# Altium footprint library PROC051C_PCB.PcbLib: 118 footprints (part 7 of 8)
Each footprint in its own frame and in the unit in brackets; x right, y up, seen from the top. Pads: shape width x height; smd on the part's side, far side on the other; paste and mask are expansions set on the pad; w line width, h text height; cw(c..) or ccw(c..) is an arc to the next point about the centre after c.
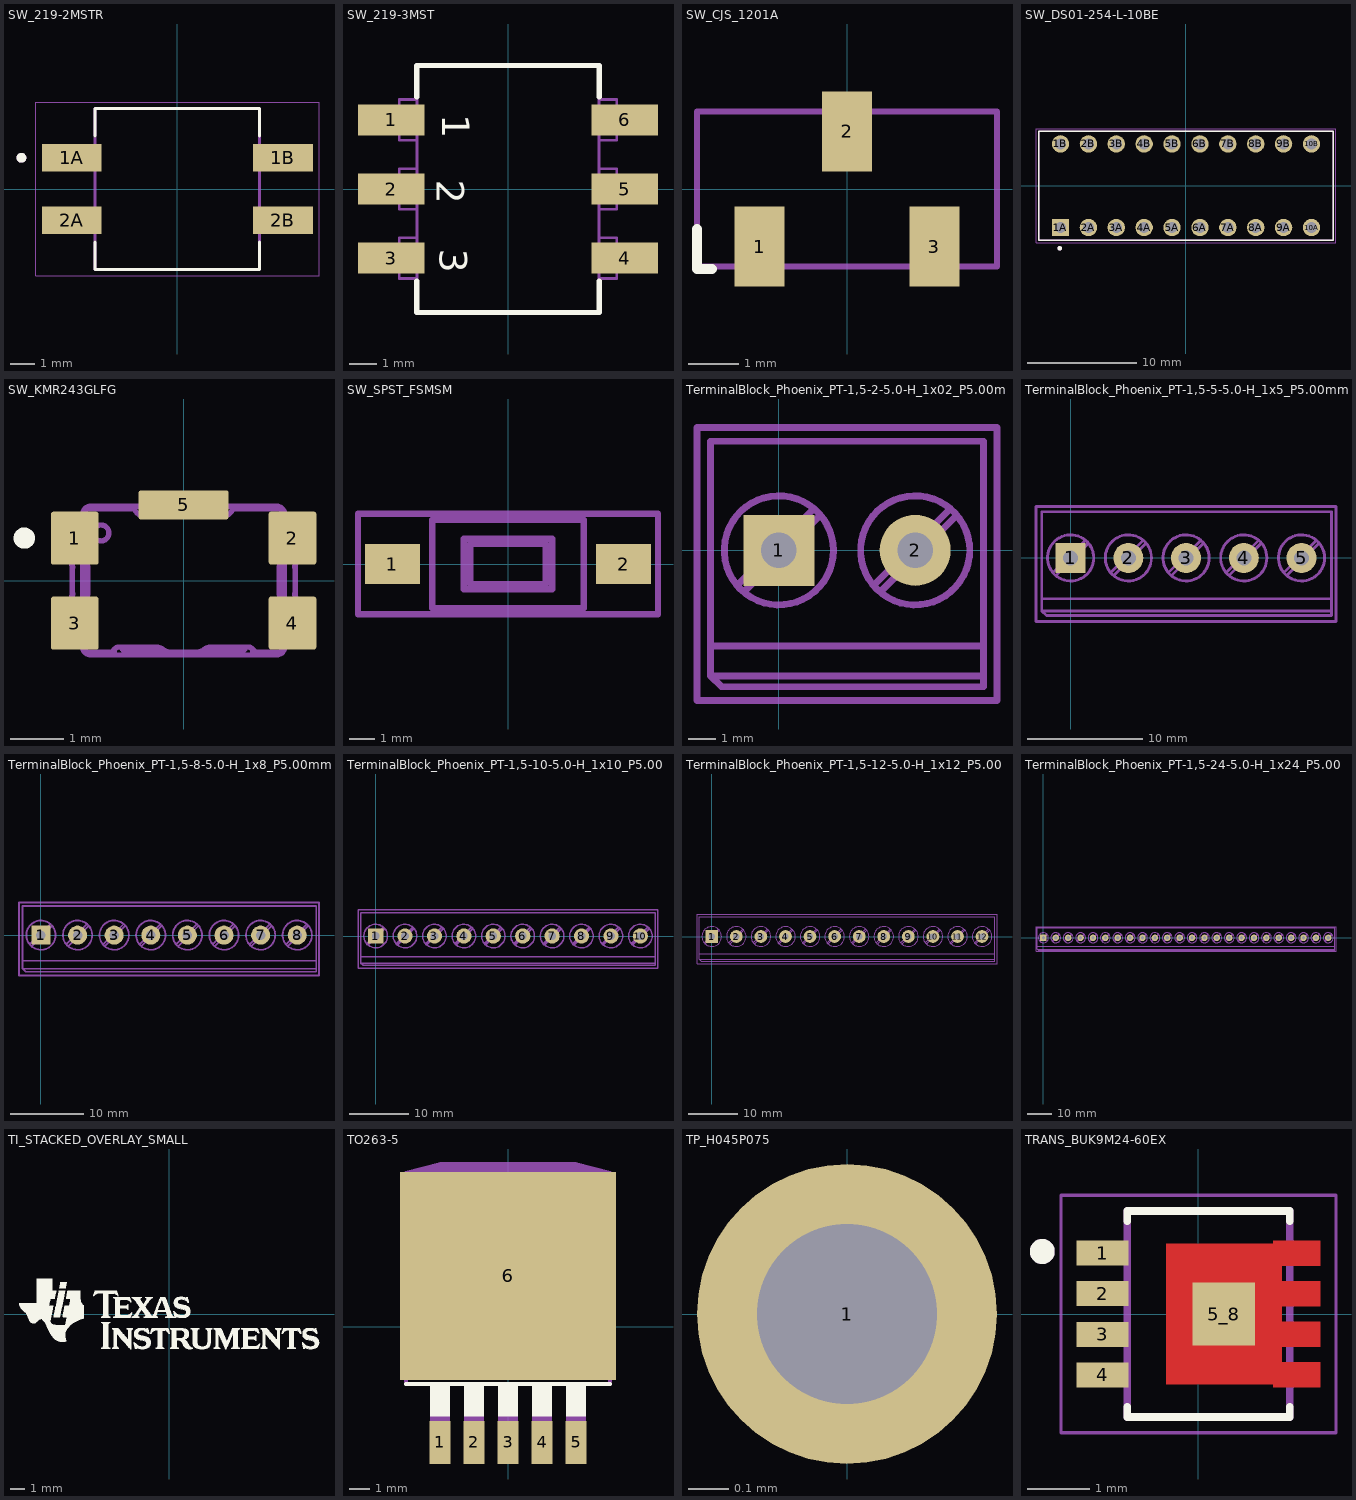
[diagram p6: the footprints below, top view; thin cyan lines are the x and y axes]

## SW_219-2MSTR [mm]
height 3.85
pads (4):
  rect 2.44x1.13 smd: 1A(-4.3,1.27) 1B(4.3,1.27) 2A(-4.3,-1.27) 2B(4.3,-1.27)
Top Overlay:
  circle w0.2: c-6.35,1.27 r0.1
  lines w0.127: -3.35,-2.155 -3.35,-3.275 3.35,-3.275 3.35,-2.155 ; -3.35,2.155 -3.35,3.275 3.35,3.275 3.35,2.155
Mechanical 13:
  circle w0.2: c-6.35,1.27 r0.1
  lines w0.127: -3.35,-3.275 3.35,-3.275 3.35,3.275 -3.35,3.275 -3.35,-3.275
Mechanical 15:
  lines w0.05: -5.77,-3.525 -5.77,3.525 5.77,3.525 5.77,-3.525 -5.77,-3.525
3D body "step_temp.STEP": height 4.58, standoff 0, extent -4.955,-3.275 4.955,3.275

## SW_219-3MST [mm] "SMD, 6-Leads, Body 6.7x9.09mm, Pitch 2.54mm"
height 4.23
pads (6):
  rect 2.44x1.13 smd: 1(-4.3,2.54) 2(-4.3,0) 3(-4.3,-2.54) 4(4.3,-2.54) 5(4.3,0) 6(4.3,2.54)
Top Overlay:
  lines w0.2: -3.35,-3.4 -3.35,-4.545 3.35,-4.545 3.35,-3.4 ; -3.35,3.4 -3.35,4.545 3.35,4.545 3.35,3.4
  text "1" at -2.422,2.758 h1.02
  text "2" at -2.63,0.336 h1.02
  text "3" at -2.504,-2.204 h1.02
Mechanical 5:
  lines w0.1: -4,-2.815 -4.955,-2.815 -4.955,-2.265 -4,-2.265 ; -4,-0.275 -4.955,-0.275 -4.955,0.275 -4,0.275 ; -4,2.265 -4.955,2.265 -4.955,2.815 -4,2.815 ; -3.35,-3.29 -3.8,-3.29 -4,-3.29 -4,-1.79 -3.8,-1.79 -3.35,-1.79 ; -3.35,-0.75 -3.8,-0.75 -4,-0.75 -4,0.75 -3.8,0.75 -3.35,0.75 ; -3.35,1.79 -3.8,1.79 -4,1.79 -4,3.29 -3.8,3.29 -3.35,3.29 ; 3.35,-3.29 3.8,-3.29 4,-3.29 4,-1.79 3.8,-1.79 3.35,-1.79 ; 3.35,-0.75 3.8,-0.75 4,-0.75 4,0.75 3.8,0.75 3.35,0.75 ; 3.35,1.79 3.8,1.79 4,1.79 4,3.29 3.8,3.29 3.35,3.29 ; 4,-2.815 4.955,-2.815 4.955,-2.265 4,-2.265 ; 4,-0.275 4.955,-0.275 4.955,0.275 4,0.275 ; 4,2.265 4.955,2.265 4.955,2.815 4,2.815 ; -3.35,-4.545 -3.35,4.545 3.35,4.545 3.35,-3.545 3.35,-4.545 -3.35,-4.545
  text ".Designator" at -0.52,1.29 h1.85
  text "3" at -2.504,-2.204 h1.02
  text "2" at -2.63,0.336 h1.02
  text "1" at -2.422,2.758 h1.02
3D body: height 4.3, standoff 0, extent -4.955,-4.545 4.955,4.545

## SW_CJS_1201A [mm] "Copal- Electronics"
height 2.5
pads (3):
  rect 1x1.6 smd paste+0 mask+0.05: 1(-1.75,-1.15) 2(0,1.15) 3(1.75,-1.15)
Top Overlay:
  lines w0.2: -3,-0.8 -3,-1.6 -2.7,-1.6
Mechanical 5:
  lines w0.127: -3,-1.55 3,-1.55 3,1.55 -3,1.55 -3,-1.55
  text ".Designator" at -2.25,-0.25 h1.02
3D body: height 2.51, standoff 1, extent -1.5,-0.5 1.5,0.5
3D body: height 2.5, standoff 0, extent -2.999,-1.549 2.999,1.549

## SW_DS01-254-L-10BE [mm]
height 7
pads (20):
  rect 1.58x1.58 / inner round 1.58 / far side rect 1.58x1.58 hole 1: 1A(-11.43,-3.81)
  round 1.58 hole 1: 1B(-11.43,3.81) 2A(-8.89,-3.81) 2B(-8.89,3.81) 3A(-6.35,-3.81) 3B(-6.35,3.81) 4A(-3.81,-3.81) 4B(-3.81,3.81) 5A(-1.27,-3.81) 5B(-1.27,3.81) 6A(1.27,-3.81) 6B(1.27,3.81) 7A(3.81,-3.81) 7B(3.81,3.81) 8A(6.35,-3.81) 8B(6.35,3.81) 9A(8.89,-3.81) 9B(8.89,3.81) 10A(11.43,-3.81) 10B(11.43,3.81)
Top Overlay:
  circle w0.2: c-11.5,-5.7 r0.1
  lines w0.127: -13.41,-4.95 13.41,-4.95 13.41,4.95 -13.41,4.95 -13.41,-4.95
Mechanical 13:
  circle w0.2: c-11.5,-5.7 r0.1
  lines w0.127: -13.41,-4.95 13.41,-4.95 13.41,4.95 -13.41,4.95 -13.41,-4.95
Mechanical 15:
  lines w0.05: -13.66,-5.2 13.66,-5.2 13.66,5.2 -13.66,5.2 -13.66,-5.2
3D body "step_temp.STEP": height 5.18, standoff -5.18, extent -13.41,-4.947 13.41,4.953

## SW_KMR243GLFG [mm] "SMD, 5-Leads, Body 4.2x2.8mm"
height 1.9
pads (5):
  rrect11% 0.9x1 smd: 1(-2.05,0.8) 2(2.05,0.8) 3(-2.05,-0.8) 4(2.05,-0.8)
  rrect18% 1.7x0.55 smd: 5(0,1.425)
Top Overlay:
  circle w0.2: c-3,0.8 r0.1
Mechanical 5:
  drawing of 4459 lines, arcs and shapes, not listed
  text ".Designator" at 0.855,0.117 h1
3D body: height 1.92, standoff -0.02, extent -2.3,-1.4 2.3,1.4

## SW_SPST_FSMSM [mm]
pads (2):
  rect 2.18x1.6 smd: 1(-4.59,0) 2(4.59,0)
Mechanical 4:
  lines w0.254: -5.95,-2 5.95,-2 5.95,2 -5.95,2 -5.95,-2
Mechanical 6:
  lines w0.254: -3,-1.75 3,-1.75 3,1.75 -3,1.75 -3,-1.75 ; -1.75,-1 1.75,-1 1.75,1 -1.75,1 -1.75,-1 ; -1.5,-0.8 1.5,-0.8 1.5,0.8 -1.5,0.8 -1.5,-0.8
  text "'.Designator'" at -1.439,2.202 h1
3D body "SW_SPST_FSMSM.step": height 2, standoff 0, extent -4.5,-1.722 4.5,1.778

## TerminalBlock_Phoenix_PT-1,5-2-5.0-H_1x02_P5.00mm_Horizontal [mm]
pads (2):
  rect 2.6x2.6 hole 1.3: 1(0,0)
  round 2.6 hole 1.3: 2(5,0)
Mechanical 4:
  lines w0.254: -3,-5.5 8,-5.5 8,4.5 -3,4.5 -3,-5.5
Mechanical 6:
  circle w0.254: c5,0 r2
  circle w0.254: c0,0 r2
  lines w0.254: -2.5,-3.5 7.5,-3.5 ; -1.517,-1.273 1.273,1.517 ; -1.273,-1.517 1.517,1.273 ; 3.484,-1.273 6.273,1.517 ; 3.728,-1.517 6.517,1.273 ; 7.5,-4.6 -2.5,-4.6 ; -2.5,-4.6 -2.1,-5 7.5,-5 7.5,4 -2.5,4 -2.5,-4.6
  text "'.Designator'" at 1.061,-3.298 h1
3D body "TerminalBlock_Phoenix_PT-1,5-2-5.0-H_1x02_P5.00mm_Horizontal.step": height 11.4, standoff -3.6, extent -2.5,-5 8.07,4

## TerminalBlock_Phoenix_PT-1,5-5-5.0-H_1x5_P5.00mm_Horizontal [mm]
pads (5):
  rect 2.6x2.6 hole 1.3: 1(0,0)
  round 2.6 hole 1.3: 2(5,0) 3(10,0) 4(15,0) 5(20,0)
Mechanical 4:
  lines w0.254: -3,-5.5 -3,4.445 22.987,4.445 22.987,-5.5 -3,-5.5
Mechanical 6:
  circle w0.254: c20,0 r2
  circle w0.254: c15,0 r2
  circle w0.254: c10,0 r2
  circle w0.254: c5,0 r2
  circle w0.254: c0,0 r2
  lines w0.254: -2.5,-3.5 22.606,-3.535 ; -1.517,-1.273 1.273,1.517 ; -1.273,-1.517 1.517,1.273 ; 3.484,-1.273 6.273,1.517 ; 3.728,-1.517 6.517,1.273 ; 8.484,-1.273 11.273,1.517 ; 8.728,-1.517 11.517,1.273 ; 13.484,-1.273 16.273,1.517 ; 13.728,-1.517 16.517,1.273 ; 18.484,-1.273 21.273,1.517 ; 18.728,-1.517 21.517,1.273 ; 22.606,-4.6 -2.5,-4.6 ; -2.5,-4.6 -2.1,-5 22.606,-5 22.606,-2.75 22.606,1.75 22.606,4 -2.5,4 -2.5,-4.6
  text "'.Designator'" at 8.763,-3.048 h1
3D body "TerminalBlock_Phoenix_PT-1,5-5-5.0-H_1x05_P5.00mm_Horizontal.step": height 11.4, standoff -3.6, extent -2.54,-4.936 23.03,4.064

## TerminalBlock_Phoenix_PT-1,5-8-5.0-H_1x8_P5.00mm_Horizontal [mm]
pads (8):
  rect 2.6x2.6 hole 1.3: 1(0,0)
  round 2.6 hole 1.3: 2(5,0) 3(10,0) 4(15,0) 5(20,0) 6(25,0) 7(30,0) 8(35,0)
Mid-Layer 26:
  circle w0.254: c0,0 r2.18
  circle w0.254: c5,0 r2.18
  circle w0.254: c10,0 r2.18
  circle w0.254: c15,0 r2.18
  circle w0.254: c20,0 r2.18
  circle w0.254: c25,0 r2.18
  circle w0.254: c30,0 r2.18
  circle w0.254: c35,0 r2.18
  lines w0.254: -2.8,-4.66 -2.8,-5.3 -2.4,-5.3 ; -2.56,-4.6 37.592,-4.6 ; -2.56,-3.5 37.592,-3.5 ; -1.654,-1.388 -1.548,-1.281 ; -1.388,-1.654 -1.282,-1.547 ; 1.281,1.547 1.388,1.654 ; 1.547,1.281 1.654,1.388 ; 3.347,-1.388 3.742,-0.992 ; 3.613,-1.654 3.993,-1.274 ; 6.008,1.274 6.388,1.654 ; 6.259,0.992 6.654,1.388 ; 8.347,-1.388 8.742,-0.992 ; 8.613,-1.654 8.993,-1.274 ; 11.008,1.274 11.388,1.654 ; 11.259,0.992 11.654,1.388 ; 13.347,-1.388 13.742,-0.992 ; 13.613,-1.654 13.993,-1.274 ; 16.008,1.274 16.388,1.654 ; 16.259,0.992 16.654,1.388 ; 18.347,-1.388 18.742,-0.992 ; 18.613,-1.654 18.993,-1.274 ; 21.008,1.274 21.388,1.654 ; 21.259,0.992 21.654,1.388 ; 23.347,-1.388 23.742,-0.992 ; 23.613,-1.654 23.993,-1.274 ; 26.008,1.274 26.388,1.654 ; 26.259,0.992 26.654,1.388 ; 28.347,-1.388 28.742,-0.992 ; 28.613,-1.654 28.993,-1.274 ; 31.008,1.274 31.388,1.654 ; 31.259,0.992 31.654,1.388 ; 33.347,-1.388 33.742,-0.992 ; 33.613,-1.654 33.993,-1.274 ; 36.008,1.274 36.388,1.654 ; 36.259,0.992 36.654,1.388 ; -2.56,-5.06 -2.56,4.06 37.592,4.06 37.592,-5.06 -2.56,-5.06
Mechanical 4:
  lines w0.254: -3,-5.5 37.973,-5.5 37.973,4.445 -3,4.445 -3,-5.5
Mechanical 6:
  circle w0.254: c0,0 r2
  circle w0.254: c5,0 r2
  circle w0.254: c10,0 r2
  circle w0.254: c15,0 r2
  circle w0.254: c20,0 r2
  circle w0.254: c25,0 r2
  circle w0.254: c30,0 r2
  circle w0.254: c35,0 r2
  lines w0.254: -2.5,-3.5 37.592,-3.556 ; -1.517,-1.273 1.273,1.517 ; -1.273,-1.517 1.517,1.273 ; 3.484,-1.273 6.273,1.517 ; 3.728,-1.517 6.517,1.273 ; 8.484,-1.273 11.273,1.517 ; 8.728,-1.517 11.517,1.273 ; 13.484,-1.273 16.273,1.517 ; 13.728,-1.517 16.517,1.273 ; 18.484,-1.273 21.273,1.517 ; 18.728,-1.517 21.517,1.273 ; 23.484,-1.273 26.273,1.517 ; 23.728,-1.517 26.517,1.273 ; 28.484,-1.273 31.273,1.517 ; 28.728,-1.517 31.517,1.273 ; 33.484,-1.273 36.273,1.517 ; 33.728,-1.517 36.517,1.273 ; 37.592,-4.6 -2.5,-4.6 ; -2.5,-4.6 -2.5,4 37.592,4 37.592,1.75 37.592,-2.75 37.592,-5 -2.1,-5 -2.5,-4.6
  text "'.Designator'" at 21.061,-3.298 h1

## TerminalBlock_Phoenix_PT-1,5-10-5.0-H_1x10_P5.00mm_Horizontal [mm]
pads (10):
  rect 2.6x2.6 hole 1.3: 1(0,0)
  round 2.6 hole 1.3: 2(5,0) 3(10,0) 4(15,0) 5(20,0) 6(25,0) 7(30,0) 8(35,0) 9(40,0) 10(45,0)
Mechanical 4:
  lines w0.254: -3,-5.5 -3,4.5 48,4.5 48,-5.5 -3,-5.5
Mechanical 6:
  circle w0.254: c0,0 r2
  circle w0.254: c5,0 r2
  circle w0.254: c10,0 r2
  circle w0.254: c15,0 r2
  circle w0.254: c20,0 r2
  circle w0.254: c25,0 r2
  circle w0.254: c30,0 r2
  circle w0.254: c35,0 r2
  circle w0.254: c40,0 r2
  circle w0.254: c45,0 r2
  lines w0.254: -2.5,-3.5 47.5,-3.5 ; -1.517,-1.273 1.273,1.517 ; -1.273,-1.517 1.517,1.273 ; 3.484,-1.273 6.273,1.517 ; 3.728,-1.517 6.517,1.273 ; 8.484,-1.273 11.273,1.517 ; 8.728,-1.517 11.517,1.273 ; 13.484,-1.273 16.273,1.517 ; 13.728,-1.517 16.517,1.273 ; 18.484,-1.273 21.273,1.517 ; 18.728,-1.517 21.517,1.273 ; 23.484,-1.273 26.273,1.517 ; 23.728,-1.517 26.517,1.273 ; 28.484,-1.273 31.273,1.517 ; 28.728,-1.517 31.517,1.273 ; 33.484,-1.273 36.273,1.517 ; 33.728,-1.517 36.517,1.273 ; 38.484,-1.273 41.273,1.517 ; 38.728,-1.517 41.517,1.273 ; 43.484,-1.273 46.273,1.517 ; 43.728,-1.517 46.517,1.273 ; 47.5,-4.6 -2.5,-4.6 ; -2.5,-4.6 -2.5,4 47.5,4 47.5,-5 -2.1,-5 -2.5,-4.6
  text "'.Designator'" at 21.061,-3.298 h1
3D body "TerminalBlock_Phoenix_PT-1,5-10-5.0-H_1x10_P5.00mm_Horizontal.step": height 11.4, standoff -3.6, extent -2.54,-4.936 48.03,4.064

## TerminalBlock_Phoenix_PT-1,5-12-5.0-H_1x12_P5.00mm_Horizontal [mm]
pads (12):
  rect 2.6x2.6 hole 1.3: 1(0,0)
  round 2.6 hole 1.3: 2(5,0) 3(10,0) 4(15,0) 5(20,0) 6(25,0) 7(30,0) 8(35,0) 9(40,0) 10(45,0) 11(50,0) 12(55,0)
Mechanical 4:
  lines w0.254: -3,-5.5 58.039,-5.5 58.039,4.5 -3,4.5 -3,-5.5
Mechanical 6:
  circle w0.254: c45,0 r2
  circle w0.254: c40,0 r2
  circle w0.254: c35,0 r2
  circle w0.254: c30,0 r2
  circle w0.254: c25,0 r2
  circle w0.254: c20,0 r2
  circle w0.254: c15,0 r2
  circle w0.254: c10,0 r2
  circle w0.254: c5,0 r2
  circle w0.254: c0,0 r2
  circle w0.254: c50,0 r2
  circle w0.254: c55,0 r2
  lines w0.254: -2.5,-3.5 57.404,-3.5 ; -1.517,-1.273 1.273,1.517 ; -1.273,-1.517 1.517,1.273 ; 3.484,-1.273 6.273,1.517 ; 3.728,-1.517 6.517,1.273 ; 8.484,-1.273 11.273,1.517 ; 8.728,-1.517 11.517,1.273 ; 13.484,-1.273 16.273,1.517 ; 13.728,-1.517 16.517,1.273 ; 18.484,-1.273 21.273,1.517 ; 18.728,-1.517 21.517,1.273 ; 23.484,-1.273 26.273,1.517 ; 23.728,-1.517 26.517,1.273 ; 28.484,-1.273 31.273,1.517 ; 28.728,-1.517 31.517,1.273 ; 33.484,-1.273 36.273,1.517 ; 33.728,-1.517 36.517,1.273 ; 38.484,-1.273 41.273,1.517 ; 38.728,-1.517 41.517,1.273 ; 43.484,-1.273 46.273,1.517 ; 43.728,-1.517 46.517,1.273 ; 48.484,-1.273 51.273,1.517 ; 48.728,-1.517 51.517,1.273 ; 53.484,-1.273 56.273,1.517 ; 53.728,-1.517 56.517,1.273 ; 57.404,-4.6 -2.5,-4.6 ; 57.531,-5 -2.1,-5 -2.5,-4.6 ; 57.531,4 -2.5,4 -2.5,-4.6 ; 57.54,-5 57.54,4
  text "'.Designator'" at 21.061,-3.298 h1
3D body "TerminalBlock_Phoenix_PT-1,5-12-5.0-H_1x12_P5.00mm_Horizontal.step": height 11.4, standoff -3.6, extent -2.54,-4.936 58.03,4.064

## TerminalBlock_Phoenix_PT-1,5-24-5.0-H_1x24_P5.00mm_Horizontal [mm]
pads (24):
  rect 2.6x2.6 hole 1.3: 1(0,0)
  round 2.6 hole 1.3: 2(5,0) 3(10,0) 4(15,0) 5(20,0) 6(25,0) 7(30,0) 8(35,0) 9(40,0) 10(45,0) 11(50,0) 12(55,0) 13(60,0) 14(65,0) 15(70,0) 16(75,0) 17(80,0) 18(85,0) 19(90,0) 20(95,0) 21(100,0) 22(105,0) 23(110,0) 24(115,0)
Mechanical 4:
  lines w0.254: -3,-5.5 118.1,-5.5 118.1,4.5 -3,4.5 -3,-5.5
Mechanical 6:
  circle w0.254: c95,0 r2
  circle w0.254: c115,0 r2
  circle w0.254: c110,0 r2
  circle w0.254: c105,0 r2
  circle w0.254: c100,0 r2
  circle w0.254: c90,0 r2
  circle w0.254: c85,0 r2
  circle w0.254: c80,0 r2
  circle w0.254: c75,0 r2
  circle w0.254: c70,0 r2
  circle w0.254: c65,0 r2
  circle w0.254: c60,0 r2
  circle w0.254: c55,0 r2
  circle w0.254: c50,0 r2
  circle w0.254: c45,0 r2
  circle w0.254: c40,0 r2
  circle w0.254: c35,0 r2
  circle w0.254: c30,0 r2
  circle w0.254: c25,0 r2
  circle w0.254: c20,0 r2
  circle w0.254: c15,0 r2
  circle w0.254: c10,0 r2
  circle w0.254: c5,0 r2
  circle w0.254: c0,0 r2
  lines w0.254: -2.5,-3.5 117.5,-3.5 ; -1.517,-1.273 1.273,1.517 ; -1.273,-1.517 1.517,1.273 ; 3.484,-1.273 6.273,1.517 ; 3.728,-1.517 6.517,1.273 ; 8.484,-1.273 11.273,1.517 ; 8.728,-1.517 11.517,1.273 ; 13.484,-1.273 16.273,1.517 ; 13.728,-1.517 16.517,1.273 ; 18.484,-1.273 21.273,1.517 ; 18.728,-1.517 21.517,1.273 ; 23.484,-1.273 26.273,1.517 ; 23.728,-1.517 26.517,1.273 ; 28.484,-1.273 31.273,1.517 ; 28.728,-1.517 31.517,1.273 ; 33.484,-1.273 36.273,1.517 ; 33.728,-1.517 36.517,1.273 ; 38.484,-1.273 41.273,1.517 ; 38.728,-1.517 41.517,1.273 ; 43.484,-1.273 46.273,1.517 ; 43.728,-1.517 46.517,1.273 ; 48.484,-1.273 51.273,1.517 ; 48.728,-1.517 51.517,1.273 ; 53.484,-1.273 56.273,1.517 ; 53.728,-1.517 56.517,1.273 ; 58.484,-1.273 61.273,1.517 ; 58.728,-1.517 61.517,1.273 ; 63.484,-1.273 66.273,1.517 ; 63.728,-1.517 66.517,1.273 ; 68.484,-1.273 71.273,1.517 ; 68.728,-1.517 71.517,1.273 ; 73.484,-1.273 76.273,1.517 ; 73.728,-1.517 76.517,1.273 ; 78.484,-1.273 81.273,1.517 ; 78.728,-1.517 81.517,1.273 ; 83.484,-1.273 86.273,1.517 ; 83.728,-1.517 86.517,1.273 ; 88.484,-1.273 91.273,1.517 ; 88.728,-1.517 91.517,1.273 ; 93.484,-1.273 96.273,1.517 ; 93.728,-1.517 96.517,1.273 ; 98.484,-1.273 101.273,1.517 ; 98.728,-1.517 101.517,1.273 ; 103.484,-1.273 106.273,1.517 ; 103.728,-1.517 106.517,1.273 ; 108.484,-1.273 111.273,1.517 ; 108.728,-1.517 111.517,1.273 ; 113.484,-1.273 116.273,1.517 ; 113.728,-1.517 116.517,1.273 ; 117.5,-4.6 -2.5,-4.6 ; -2.5,-4.6 -2.1,-5 117.6,-5 117.6,4 -2.5,4 -2.5,-4.6
  text "'.Designator'" at 26.061,-3.298 h1
3D body "TerminalBlock_Phoenix_PT-1,5-12-5.0-H_1x12_P5.00mm_Horizontal.step": height 11.4, standoff -3.6, extent -2.54,-4.936 58.03,4.064
3D body "TerminalBlock_Phoenix_PT-1,5-12-5.0-H_1x12_P5.00mm_Horizontal.step": height 11.4, standoff -3.6, extent 57.404,-4.936 117.974,4.064

## TI_STACKED_OVERLAY_SMALL [mm]
height 0.6
Top Overlay:
  drawing of 18 lines, arcs and shapes, not listed

## TO263-5 [mil]
pads (6):
  rect 42x85 smd: 1(-134,-228) 2(-67,-228) 3(0,-228) 4(67,-228) 5(134,-228)
  rect 425.2x409.84 smd: 6(0,100)
Top Overlay:
  region: -115,-176 -153,-176 -153,-110 -115,-110
  region: -48,-176 -86,-176 -86,-110 -48,-110
  region: 19,-176 -19,-176 -19,-110 19,-110
  region: 86,-176 48,-176 48,-110 86,-110
  region: 153,-176 115,-176 115,-110 153,-110
  lines w8: -200.55,-113.39 200.55,-113.39
Mechanical 13:
  region: -115,-260 -153,-260 -153,-175 -115,-175
  region: -48,-260 -86,-260 -86,-175 -48,-175
  region: 19,-260 -19,-260 -19,-175 19,-175
  region: 86,-260 48,-260 48,-175 86,-175
  region: 153,-260 115,-260 115,-175 153,-175
  region: 201,302.29 201,286.1 -201,286.1 -201,302.29 -133,320.29 133,320.29
  lines w8: -200.55,-113.39 -200.55,282.09 200.55,282.09 200.55,-113.39 ; -200.98,286.1 -200.98,302.28 -132.99,320.28 132.99,320.28 200.98,302.28 200.98,286.1 -200.98,286.1
3D body "TO-263-5_TabPin6.step": height 174.02, standoff 0, extent -196.85,-259.09 196.85,331.46

## TP_H045P075 [mm] "TP_H0.45P0.75"
pads (1):
  round 0.75 hole 0.45: 1(0,0)

## TRANS_BUK9M24-60EX [mm]
height 0.9
pads (5):
  rect 0.83x0.4 smd paste-1 mask+0.05: 1(-1.535,0.975) 2(-1.535,0.325) 3(-1.535,-0.325) 4(-1.535,-0.975)
  rect 1x1 smd paste-1 mask+0: 5_8(0.405,0)
Top Layer:
  region: 1.95,0.775 1.33,0.775 1.33,0.525 1.95,0.525 1.95,0.125 1.33,0.125 1.33,-0.125 1.95,-0.125 1.95,-0.525 1.33,-0.525 1.33,-0.775 1.95,-0.775 1.95,-1.175 1.2,-1.175 1.2,-1.125 -0.52,-1.125 -0.52,1.125 1.2,1.125 1.2,1.175 1.95,1.175
Top Overlay:
  circle w0.2: c-2.5,1 r0.1
  lines w0.127: -1.14,-1.49 -1.14,-1.65 1.46,-1.65 1.46,-1.49 ; -1.14,1.49 -1.14,1.65 1.46,1.65 1.46,1.49
Top Paste:
  region: -1.12,0.825 -1.95,0.825 -1.95,1.125 -1.12,1.125
  region: -1.12,0.175 -1.95,0.175 -1.95,0.475 -1.12,0.475
  region: -1.12,-0.475 -1.95,-0.475 -1.95,-0.175 -1.12,-0.175
  region: -1.12,-1.125 -1.95,-1.125 -1.95,-0.825 -1.12,-0.825
  region: 1.95,0.825 1.2,0.825 1.2,1.125 1.95,1.125
  region: 1.95,0.175 1.2,0.175 1.2,0.475 1.95,0.475
  region: 1.95,-0.475 1.2,-0.475 1.2,-0.175 1.95,-0.175
  region: 1.95,-1.125 1.2,-1.125 1.2,-0.825 1.95,-0.825
  region: 0.04,0.309 -0.47,0.309 -0.47,0.944 0.04,0.944
  region: 0.04,-0.944 -0.47,-0.944 -0.47,-0.309 0.04,-0.309
  region: 0.9,0.309 0.39,0.309 0.39,0.944 0.9,0.944
  region: 0.9,-0.944 0.39,-0.944 0.39,-0.309 0.9,-0.309
Top Solder:
  region: 2,0.725 1.38,0.725 1.38,0.575 2,0.575 2,0.075 1.38,0.075 1.38,-0.075 2,-0.075 2,-0.575 1.38,-0.575 1.38,-0.725 2,-0.725 2,-1.225 1.15,-1.225 1.15,-1.175 -0.57,-1.175 -0.57,1.175 1.15,1.175 1.15,1.225 2,1.225
Mechanical 13:
  circle w0.2: c-2.5,1 r0.1
  lines w0.127: -1.14,-1.65 1.46,-1.65 1.46,1.65 -1.14,1.65 -1.14,-1.65
Mechanical 15:
  lines w0.05: -2.2,-1.9 2.2,-1.9 2.2,1.9 -2.2,1.9 -2.2,-1.9
3D body "step_temp.STEP": height 0.9, standoff 0, extent -1.65,-1.65 1.65,1.65